# Altium footprint library TimeCard-NIC-V1.PcbLib: 104 footprints (part 5 of 7)
Each footprint in its own frame and in the unit in brackets; x right, y up, seen from the top. Pads: shape width x height; smd on the part's side, far side on the other; paste and mask are expansions set on the pad; w line width, h text height; cw(c..) or ccw(c..) is an arc to the next point about the centre after c.
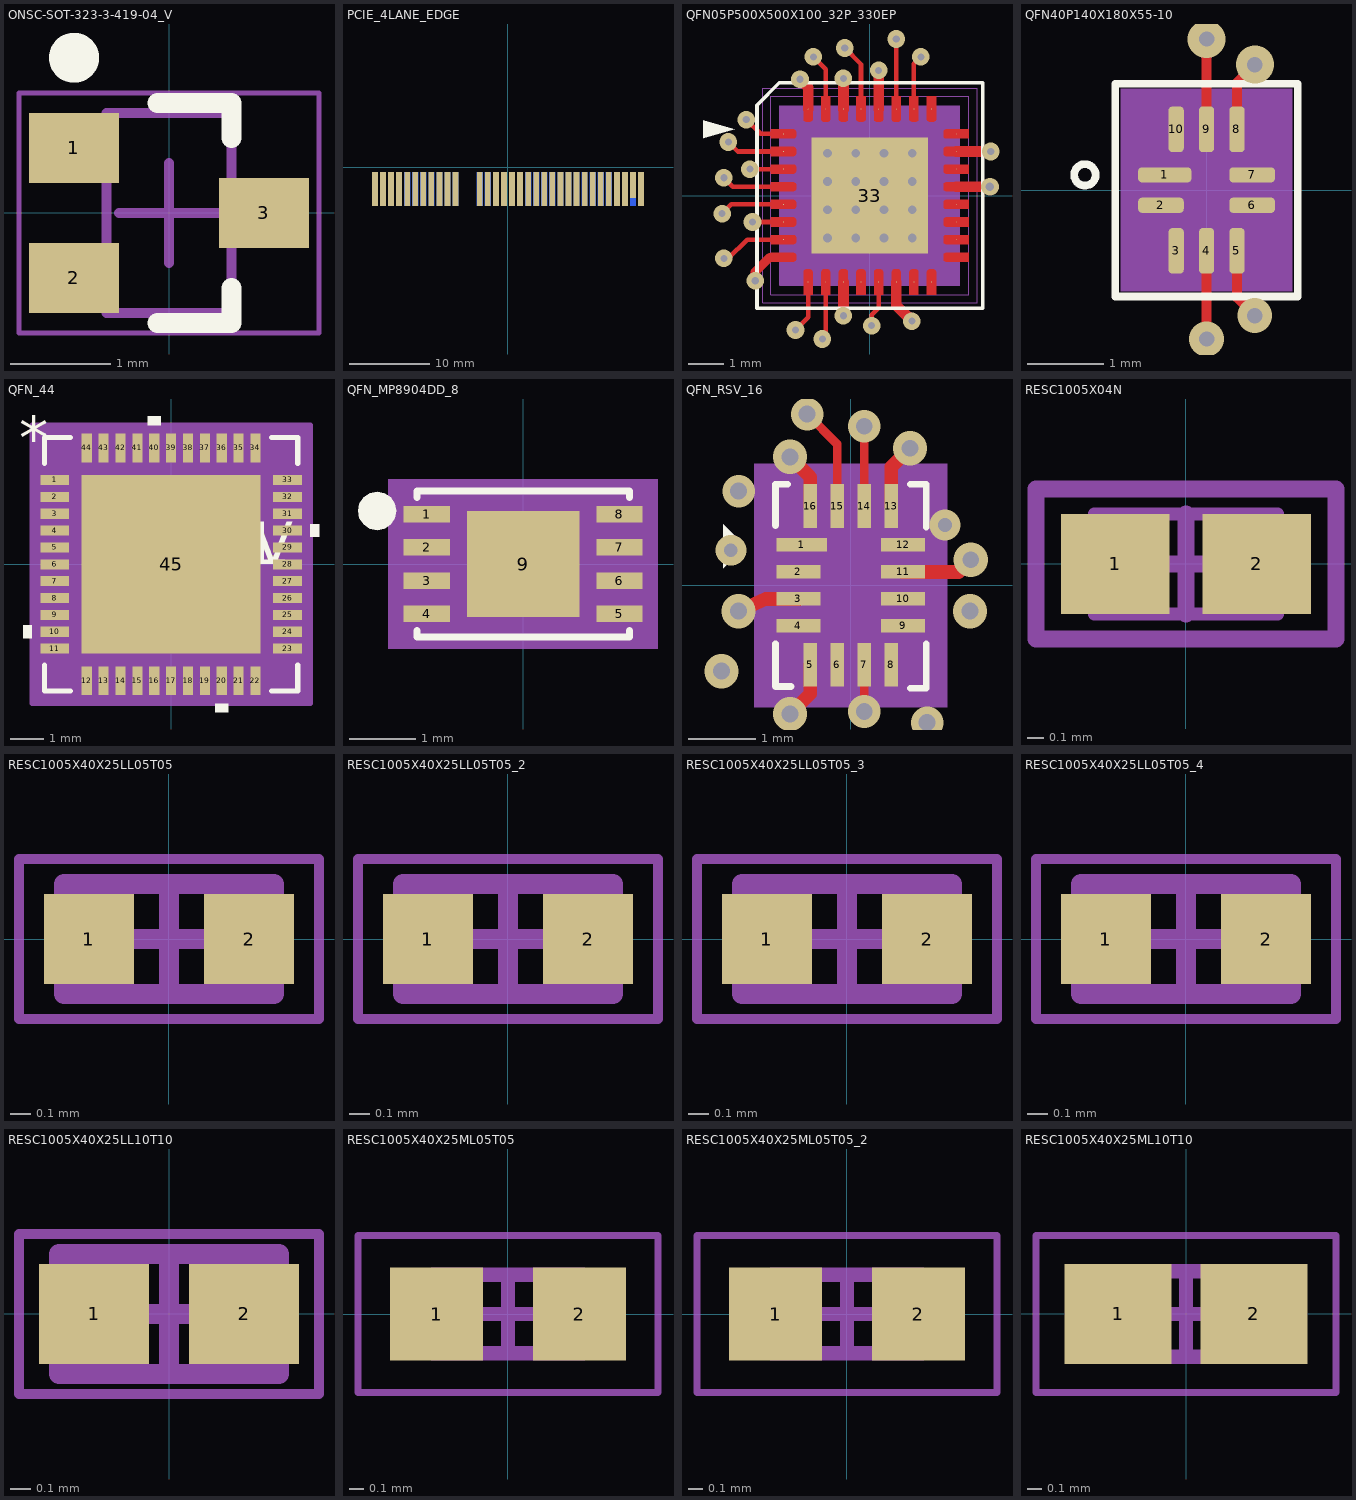
[diagram p4: the footprints below, top view; thin cyan lines are the x and y axes]

## ONSC-SOT-323-3-419-04_V [mm] "SOT23, 3-Leads, Body 2x1.25mm, Pitch 0.65mm"
height 1
pads (3):
  rect 0.9x0.7 smd: 1(-0.95,0.65) 2(-0.95,-0.65) 3(0.95,0)
Top Overlay:
  circle w0.25: c-0.95,1.55 r0.125
  lines w0.2: -0.113,-1.1 0.625,-1.1 0.625,-0.75 ; -0.113,1.1 0.625,1.1 0.625,0.75
Mechanical 13:
  lines w0.1: -0.625,-1 0.625,-1 0.625,1 -0.625,1 -0.625,-1
Mechanical 15:
  lines w0.05: -1.5,-1.2 1.5,-1.2 1.5,1.2 -1.5,1.2 -1.5,-1.2
  lines w0.1: -0.5,0 0.5,0 ; 0,-0.5 0,0.5
3D body: height 1, standoff 0, extent -0.625,-1 0.625,1

## PCIE_4LANE_EDGE [mil] "PCIE_4LANE_EDGE"
pads (64):
  rect 28x126 smd far side: A1(-649.6,-87.74)
  rect 28x165 smd far side: A2(-610.23,-107.24) A3(-570.86,-107.24) A4(-531.49,-107.24) A5(-492.12,-107.24) A6(-452.75,-107.24) A7(-413.38,-107.24) A8(-374.01,-107.24) A9(-334.64,-107.24) A10(-295.27,-107.24) A11(-255.9,-107.24) A12(-137.79,-107.24) A13(-98.42,-107.24) A14(-59.05,-107.24) A15(-19.68,-107.24) A16(19.69,-107.24) A17(59.06,-107.24) A18(98.43,-107.24) A19(137.8,-107.24) A20(177.17,-107.24) A21(216.54,-107.24) A22(255.91,-107.24) A23(295.28,-107.24) A24(334.65,-107.24) A25(374.02,-107.24) A26(413.39,-107.24) A27(452.76,-107.24) A28(492.13,-107.24) A29(531.5,-107.24) A30(570.87,-107.24) A31(610.24,-107.24) A32(649.61,-107.24)
  rect 28x165 smd: B1(-649.6,-107.24) B2(-610.23,-107.24) B3(-570.86,-107.24) B4(-531.49,-107.24) B5(-492.12,-107.24) B6(-452.75,-107.24) B7(-413.38,-107.24) B8(-374.01,-107.24) B9(-334.64,-107.24) B10(-295.27,-107.24) B11(-255.9,-107.24) B12(-137.79,-107.24) B13(-98.42,-107.24) B14(-59.05,-107.24) B15(-19.68,-107.24) B16(19.69,-107.24) B17(59.06,-107.24) B18(98.43,-107.24) B19(137.8,-107.24) B20(177.17,-107.24) B21(216.54,-107.24) B22(255.91,-107.24) B23(295.28,-107.24) B24(334.65,-107.24) B25(374.02,-107.24) B26(413.39,-107.24) B27(452.76,-107.24) B28(492.13,-107.24) B29(531.5,-107.24) B30(570.87,-107.24) B32(649.61,-107.24)
  rect 28x126 smd: B31(610.24,-87.74)

## QFN05P500X500X100_32P_330EP [mil] "QFN05P500X500X100_32P_330EP"
height 427.17
pads (33):
  oct 1x1 smd: 1(-96.5,68.9) 2(-96.5,49.21) 3(-96.5,29.53) 4(-96.5,9.84) 5(-96.5,-9.84) 6(-96.5,-29.53) 7(-96.5,-49.21) 8(-96.5,-68.9) 9(-68.9,-96.5) 10(-49.21,-96.5) 11(-29.53,-96.5) 12(-9.84,-96.5) 13(9.84,-96.5) 14(29.53,-96.5) 15(49.21,-96.5) 16(68.9,-96.5) 17(96.5,-68.9) 18(96.5,-49.21) 19(96.5,-29.53) 20(96.5,-9.84) 21(96.5,9.84) 22(96.5,29.53) 23(96.5,49.21) 24(96.5,68.9) 25(68.9,96.5) 26(49.21,96.5) 27(29.53,96.5) 28(9.84,96.5) 29(-9.84,96.5) 30(-29.53,96.5) 31(-49.21,96.5) 32(-68.9,96.5)
  rect 129.92x129.92 smd: 33(0,0)
via -53,-160.16 diameter 19.68 hole 8
via -83,-150.16 diameter 19.68 hole 8
via 2,-145.16 diameter 19.68 hole 8
via 47,-140.16 diameter 19.68 hole 8
via -29.53,-134.16 diameter 19.68 hole 8
via -128,-95.16 diameter 19.68 hole 8
via -163,-70.16 diameter 19.68 hole 8
via -47.24,-47.24 diameter 19 hole 9.8
via -15.75,-47.24 diameter 19 hole 9.8
via 15.75,-47.24 diameter 19 hole 9.8
via 47.24,-47.24 diameter 19 hole 9.8
via -131,-29.53 diameter 19.68 hole 8
via -165,-20.16 diameter 19.68 hole 8
via -47.24,-15.75 diameter 19 hole 9.8
via -15.75,-15.75 diameter 19 hole 9.8
via 15.75,-15.75 diameter 19 hole 9.8
via 47.24,-15.75 diameter 19 hole 9.8
via 134,9.84 diameter 20 hole 9.8
via -47.24,15.75 diameter 19 hole 9.8
via -15.75,15.75 diameter 19 hole 9.8
via 15.75,15.75 diameter 19 hole 9.8
via 47.24,15.75 diameter 19 hole 9.8
via -163,19.84 diameter 19.68 hole 8
via -134,29.53 diameter 19.68 hole 8
via -47.24,47.24 diameter 19 hole 9.8
via -15.75,47.24 diameter 19 hole 9.8
via 15.75,47.24 diameter 19 hole 9.8
via 47.24,47.24 diameter 19 hole 9.8
via 135,49.21 diameter 19.68 hole 8
via -158,59.84 diameter 19.68 hole 8
via -138,84.84 diameter 19.68 hole 8
via -78,129.84 diameter 19.68 hole 8
via -29.53,130.84 diameter 19.68 hole 8
via 9.84,139.84 diameter 19.68 hole 8
via -63,154.84 diameter 19.68 hole 8
via 57,154.84 diameter 19.68 hole 8
via -28,164.84 diameter 19.68 hole 8
via 29.53,174.84 diameter 19.68 hole 8
Top Layer:
  region: -66.93,-82.33 -70.87,-82.33 -71.49,-82.33 -72.65,-82.81 -73.54,-83.69 -74.02,-84.85 -74.02,-85.48 -74.02,-110.67 -63.78,-110.67 -63.78,-85.48 -63.78,-84.85 -64.26,-83.69 -65.14,-82.81 -66.3,-82.33
  region: -66.93,-82.33 -70.87,-82.33 -71.49,-82.33 -72.65,-82.81 -73.54,-83.69 -74.02,-84.85 -74.02,-85.48 -74.02,-110.67 -63.78,-110.67 -63.78,-85.48 -63.78,-84.85 -64.26,-83.69 -65.14,-82.81 -66.3,-82.33
  region: -47.24,-82.33 -51.18,-82.33 -51.81,-82.33 -52.97,-82.81 -53.85,-83.69 -54.33,-84.85 -54.33,-85.48 -54.33,-110.67 -44.09,-110.67 -44.09,-85.48 -44.09,-84.85 -44.57,-83.69 -45.46,-82.81 -46.62,-82.33
  region: -47.24,-82.33 -51.18,-82.33 -51.81,-82.33 -52.97,-82.81 -53.85,-83.69 -54.33,-84.85 -54.33,-85.48 -54.33,-110.67 -44.09,-110.67 -44.09,-85.48 -44.09,-84.85 -44.57,-83.69 -45.46,-82.81 -46.62,-82.33
  region: -27.56,-82.33 -31.5,-82.33 -32.12,-82.33 -33.28,-82.81 -34.17,-83.69 -34.65,-84.85 -34.65,-85.48 -34.65,-110.67 -24.41,-110.67 -24.41,-85.48 -24.41,-84.85 -24.89,-83.69 -25.77,-82.81 -26.93,-82.33
  region: -27.56,-82.33 -31.5,-82.33 -32.12,-82.33 -33.28,-82.81 -34.17,-83.69 -34.65,-84.85 -34.65,-85.48 -34.65,-110.67 -24.41,-110.67 -24.41,-85.48 -24.41,-84.85 -24.89,-83.69 -25.77,-82.81 -26.93,-82.33
  region: -7.87,-82.33 -11.81,-82.33 -12.44,-82.33 -13.6,-82.81 -14.48,-83.69 -14.96,-84.85 -14.96,-85.48 -14.96,-110.67 -4.72,-110.67 -4.72,-85.48 -4.72,-84.85 -5.2,-83.69 -6.09,-82.81 -7.25,-82.33
  region: -7.87,-82.33 -11.81,-82.33 -12.44,-82.33 -13.6,-82.81 -14.48,-83.69 -14.96,-84.85 -14.96,-85.48 -14.96,-110.67 -4.72,-110.67 -4.72,-85.48 -4.72,-84.85 -5.2,-83.69 -6.09,-82.81 -7.25,-82.33
  region: 11.81,-82.33 7.87,-82.33 7.25,-82.33 6.09,-82.81 5.2,-83.69 4.72,-84.85 4.72,-85.48 4.72,-110.67 14.96,-110.67 14.96,-85.48 14.96,-84.85 14.48,-83.69 13.6,-82.81 12.44,-82.33
  region: 11.81,-82.33 7.87,-82.33 7.25,-82.33 6.09,-82.81 5.2,-83.69 4.72,-84.85 4.72,-85.48 4.72,-110.67 14.96,-110.67 14.96,-85.48 14.96,-84.85 14.48,-83.69 13.6,-82.81 12.44,-82.33
  region: 31.5,-82.33 27.56,-82.33 26.93,-82.33 25.77,-82.81 24.89,-83.69 24.41,-84.85 24.41,-85.48 24.41,-110.67 34.65,-110.67 34.65,-85.48 34.65,-84.85 34.17,-83.69 33.28,-82.81 32.12,-82.33
  region: 31.5,-82.33 27.56,-82.33 26.93,-82.33 25.77,-82.81 24.89,-83.69 24.41,-84.85 24.41,-85.48 24.41,-110.67 34.65,-110.67 34.65,-85.48 34.65,-84.85 34.17,-83.69 33.28,-82.81 32.12,-82.33
  region: 51.18,-82.33 47.24,-82.33 46.62,-82.33 45.46,-82.81 44.57,-83.69 44.09,-84.85 44.09,-85.48 44.09,-110.67 54.33,-110.67 54.33,-85.48 54.33,-84.85 53.85,-83.69 52.97,-82.81 51.81,-82.33
  region: 51.18,-82.33 47.24,-82.33 46.62,-82.33 45.46,-82.81 44.57,-83.69 44.09,-84.85 44.09,-85.48 44.09,-110.67 54.33,-110.67 54.33,-85.48 54.33,-84.85 53.85,-83.69 52.97,-82.81 51.81,-82.33
  region: 70.87,-82.33 66.93,-82.33 66.3,-82.33 65.14,-82.81 64.26,-83.69 63.78,-84.85 63.78,-85.48 63.78,-110.67 74.02,-110.67 74.02,-85.48 74.02,-84.85 73.54,-83.69 72.65,-82.81 71.49,-82.33
  region: 70.87,-82.33 66.93,-82.33 66.3,-82.33 65.14,-82.81 64.26,-83.69 63.78,-84.85 63.78,-85.48 63.78,-110.67 74.02,-110.67 74.02,-85.48 74.02,-84.85 73.54,-83.69 72.65,-82.81 71.49,-82.33
  region: -82.33,-70.87 -82.33,-66.93 -82.33,-66.3 -82.81,-65.14 -83.69,-64.26 -84.85,-63.78 -85.48,-63.78 -110.67,-63.78 -110.67,-74.02 -85.48,-74.02 -84.85,-74.02 -83.69,-73.54 -82.81,-72.65 -82.33,-71.49
  region: -82.33,-70.87 -82.33,-66.93 -82.33,-66.3 -82.81,-65.14 -83.69,-64.26 -84.85,-63.78 -85.48,-63.78 -110.67,-63.78 -110.67,-74.02 -85.48,-74.02 -84.85,-74.02 -83.69,-73.54 -82.81,-72.65 -82.33,-71.49
  region: 82.33,-66.93 82.33,-70.87 82.33,-71.49 82.81,-72.65 83.69,-73.54 84.85,-74.02 85.48,-74.02 110.67,-74.02 110.67,-63.78 85.48,-63.78 84.85,-63.78 83.69,-64.26 82.81,-65.14 82.33,-66.3
  region: 82.33,-66.93 82.33,-70.87 82.33,-71.49 82.81,-72.65 83.69,-73.54 84.85,-74.02 85.48,-74.02 110.67,-74.02 110.67,-63.78 85.48,-63.78 84.85,-63.78 83.69,-64.26 82.81,-65.14 82.33,-66.3
  region: -82.33,-51.18 -82.33,-47.24 -82.33,-46.62 -82.81,-45.46 -83.69,-44.57 -84.85,-44.09 -85.48,-44.09 -110.67,-44.09 -110.67,-54.33 -85.48,-54.33 -84.85,-54.33 -83.69,-53.85 -82.81,-52.97 -82.33,-51.81
  region: -82.33,-51.18 -82.33,-47.24 -82.33,-46.62 -82.81,-45.46 -83.69,-44.57 -84.85,-44.09 -85.48,-44.09 -110.67,-44.09 -110.67,-54.33 -85.48,-54.33 -84.85,-54.33 -83.69,-53.85 -82.81,-52.97 -82.33,-51.81
  region: 82.33,-47.24 82.33,-51.18 82.33,-51.81 82.81,-52.97 83.69,-53.85 84.85,-54.33 85.48,-54.33 110.67,-54.33 110.67,-44.09 85.48,-44.09 84.85,-44.09 83.69,-44.57 82.81,-45.46 82.33,-46.62
  region: 82.33,-47.24 82.33,-51.18 82.33,-51.81 82.81,-52.97 83.69,-53.85 84.85,-54.33 85.48,-54.33 110.67,-54.33 110.67,-44.09 85.48,-44.09 84.85,-44.09 83.69,-44.57 82.81,-45.46 82.33,-46.62
  region: -82.33,-31.5 -82.33,-27.56 -82.33,-26.93 -82.81,-25.77 -83.69,-24.89 -84.85,-24.41 -85.48,-24.41 -110.67,-24.41 -110.67,-34.65 -85.48,-34.65 -84.85,-34.65 -83.69,-34.17 -82.81,-33.28 -82.33,-32.12
  region: -82.33,-31.5 -82.33,-27.56 -82.33,-26.93 -82.81,-25.77 -83.69,-24.89 -84.85,-24.41 -85.48,-24.41 -110.67,-24.41 -110.67,-34.65 -85.48,-34.65 -84.85,-34.65 -83.69,-34.17 -82.81,-33.28 -82.33,-32.12
  region: 82.33,-27.56 82.33,-31.5 82.33,-32.12 82.81,-33.28 83.69,-34.17 84.85,-34.65 85.48,-34.65 110.67,-34.65 110.67,-24.41 85.48,-24.41 84.85,-24.41 83.69,-24.89 82.81,-25.77 82.33,-26.93
  region: 82.33,-27.56 82.33,-31.5 82.33,-32.12 82.81,-33.28 83.69,-34.17 84.85,-34.65 85.48,-34.65 110.67,-34.65 110.67,-24.41 85.48,-24.41 84.85,-24.41 83.69,-24.89 82.81,-25.77 82.33,-26.93
  region: -82.33,-11.81 -82.33,-7.87 -82.33,-7.25 -82.81,-6.09 -83.69,-5.2 -84.85,-4.72 -85.48,-4.72 -110.67,-4.72 -110.67,-14.96 -85.48,-14.96 -84.85,-14.96 -83.69,-14.48 -82.81,-13.6 -82.33,-12.44
  region: -82.33,-11.81 -82.33,-7.87 -82.33,-7.25 -82.81,-6.09 -83.69,-5.2 -84.85,-4.72 -85.48,-4.72 -110.67,-4.72 -110.67,-14.96 -85.48,-14.96 -84.85,-14.96 -83.69,-14.48 -82.81,-13.6 -82.33,-12.44
  region: 82.33,-7.87 82.33,-11.81 82.33,-12.44 82.81,-13.6 83.69,-14.48 84.85,-14.96 85.48,-14.96 110.67,-14.96 110.67,-4.72 85.48,-4.72 84.85,-4.72 83.69,-5.2 82.81,-6.09 82.33,-7.25
  region: 82.33,-7.87 82.33,-11.81 82.33,-12.44 82.81,-13.6 83.69,-14.48 84.85,-14.96 85.48,-14.96 110.67,-14.96 110.67,-4.72 85.48,-4.72 84.85,-4.72 83.69,-5.2 82.81,-6.09 82.33,-7.25
  region: -82.33,7.87 -82.33,11.81 -82.33,12.44 -82.81,13.6 -83.69,14.48 -84.85,14.96 -85.48,14.96 -110.67,14.96 -110.67,4.72 -85.48,4.72 -84.85,4.72 -83.69,5.2 -82.81,6.09 -82.33,7.25
  region: -82.33,7.87 -82.33,11.81 -82.33,12.44 -82.81,13.6 -83.69,14.48 -84.85,14.96 -85.48,14.96 -110.67,14.96 -110.67,4.72 -85.48,4.72 -84.85,4.72 -83.69,5.2 -82.81,6.09 -82.33,7.25
  region: 82.33,11.81 82.33,7.87 82.33,7.25 82.81,6.09 83.69,5.2 84.85,4.72 85.48,4.72 110.67,4.72 110.67,14.96 85.48,14.96 84.85,14.96 83.69,14.48 82.81,13.6 82.33,12.44
  region: 82.33,11.81 82.33,7.87 82.33,7.25 82.81,6.09 83.69,5.2 84.85,4.72 85.48,4.72 110.67,4.72 110.67,14.96 85.48,14.96 84.85,14.96 83.69,14.48 82.81,13.6 82.33,12.44
  region: -82.33,27.56 -82.33,31.5 -82.33,32.12 -82.81,33.28 -83.69,34.17 -84.85,34.65 -85.48,34.65 -110.67,34.65 -110.67,24.41 -85.48,24.41 -84.85,24.41 -83.69,24.89 -82.81,25.77 -82.33,26.93
  region: -82.33,27.56 -82.33,31.5 -82.33,32.12 -82.81,33.28 -83.69,34.17 -84.85,34.65 -85.48,34.65 -110.67,34.65 -110.67,24.41 -85.48,24.41 -84.85,24.41 -83.69,24.89 -82.81,25.77 -82.33,26.93
  region: 82.33,31.5 82.33,27.56 82.33,26.93 82.81,25.77 83.69,24.89 84.85,24.41 85.48,24.41 110.67,24.41 110.67,34.65 85.48,34.65 84.85,34.65 83.69,34.17 82.81,33.28 82.33,32.12
  region: 82.33,31.5 82.33,27.56 82.33,26.93 82.81,25.77 83.69,24.89 84.85,24.41 85.48,24.41 110.67,24.41 110.67,34.65 85.48,34.65 84.85,34.65 83.69,34.17 82.81,33.28 82.33,32.12
  region: -82.33,47.24 -82.33,51.18 -82.33,51.81 -82.81,52.97 -83.69,53.85 -84.85,54.33 -85.48,54.33 -110.67,54.33 -110.67,44.09 -85.48,44.09 -84.85,44.09 -83.69,44.57 -82.81,45.46 -82.33,46.62
  region: -82.33,47.24 -82.33,51.18 -82.33,51.81 -82.81,52.97 -83.69,53.85 -84.85,54.33 -85.48,54.33 -110.67,54.33 -110.67,44.09 -85.48,44.09 -84.85,44.09 -83.69,44.57 -82.81,45.46 -82.33,46.62
  region: 82.33,51.18 82.33,47.24 82.33,46.62 82.81,45.46 83.69,44.57 84.85,44.09 85.48,44.09 110.67,44.09 110.67,54.33 85.48,54.33 84.85,54.33 83.69,53.85 82.81,52.97 82.33,51.81
  region: 82.33,51.18 82.33,47.24 82.33,46.62 82.81,45.46 83.69,44.57 84.85,44.09 85.48,44.09 110.67,44.09 110.67,54.33 85.48,54.33 84.85,54.33 83.69,53.85 82.81,52.97 82.33,51.81
  region: -82.33,66.93 -82.33,70.87 -82.33,71.49 -82.81,72.65 -83.69,73.54 -84.85,74.02 -85.48,74.02 -110.67,74.02 -110.67,63.78 -85.48,63.78 -84.85,63.78 -83.69,64.26 -82.81,65.14 -82.33,66.3
  region: -82.33,66.93 -82.33,70.87 -82.33,71.49 -82.81,72.65 -83.69,73.54 -84.85,74.02 -85.48,74.02 -110.67,74.02 -110.67,63.78 -85.48,63.78 -84.85,63.78 -83.69,64.26 -82.81,65.14 -82.33,66.3
  region: 82.33,70.87 82.33,66.93 82.33,66.3 82.81,65.14 83.69,64.26 84.85,63.78 85.48,63.78 110.67,63.78 110.67,74.02 85.48,74.02 84.85,74.02 83.69,73.54 82.81,72.65 82.33,71.49
  region: 82.33,70.87 82.33,66.93 82.33,66.3 82.81,65.14 83.69,64.26 84.85,63.78 85.48,63.78 110.67,63.78 110.67,74.02 85.48,74.02 84.85,74.02 83.69,73.54 82.81,72.65 82.33,71.49
  region: -70.87,82.33 -66.93,82.33 -66.3,82.33 -65.14,82.81 -64.26,83.69 -63.78,84.85 -63.78,85.48 -63.78,110.67 -74.02,110.67 -74.02,85.48 -74.02,84.85 -73.54,83.69 -72.65,82.81 -71.49,82.33
  region: -70.87,82.33 -66.93,82.33 -66.3,82.33 -65.14,82.81 -64.26,83.69 -63.78,84.85 -63.78,85.48 -63.78,110.67 -74.02,110.67 -74.02,85.48 -74.02,84.85 -73.54,83.69 -72.65,82.81 -71.49,82.33
  region: -51.18,82.33 -47.24,82.33 -46.62,82.33 -45.46,82.81 -44.57,83.69 -44.09,84.85 -44.09,85.48 -44.09,110.67 -54.33,110.67 -54.33,85.48 -54.33,84.85 -53.85,83.69 -52.97,82.81 -51.81,82.33
  region: -51.18,82.33 -47.24,82.33 -46.62,82.33 -45.46,82.81 -44.57,83.69 -44.09,84.85 -44.09,85.48 -44.09,110.67 -54.33,110.67 -54.33,85.48 -54.33,84.85 -53.85,83.69 -52.97,82.81 -51.81,82.33
  region: -31.5,82.33 -27.56,82.33 -26.93,82.33 -25.77,82.81 -24.89,83.69 -24.41,84.85 -24.41,85.48 -24.41,110.67 -34.65,110.67 -34.65,85.48 -34.65,84.85 -34.17,83.69 -33.28,82.81 -32.12,82.33
  region: -31.5,82.33 -27.56,82.33 -26.93,82.33 -25.77,82.81 -24.89,83.69 -24.41,84.85 -24.41,85.48 -24.41,110.67 -34.65,110.67 -34.65,85.48 -34.65,84.85 -34.17,83.69 -33.28,82.81 -32.12,82.33
  region: -11.81,82.33 -7.87,82.33 -7.25,82.33 -6.09,82.81 -5.2,83.69 -4.72,84.85 -4.72,85.48 -4.72,110.67 -14.96,110.67 -14.96,85.48 -14.96,84.85 -14.48,83.69 -13.6,82.81 -12.44,82.33
  region: -11.81,82.33 -7.87,82.33 -7.25,82.33 -6.09,82.81 -5.2,83.69 -4.72,84.85 -4.72,85.48 -4.72,110.67 -14.96,110.67 -14.96,85.48 -14.96,84.85 -14.48,83.69 -13.6,82.81 -12.44,82.33
  region: 7.87,82.33 11.81,82.33 12.44,82.33 13.6,82.81 14.48,83.69 14.96,84.85 14.96,85.48 14.96,110.67 4.72,110.67 4.72,85.48 4.72,84.85 5.2,83.69 6.09,82.81 7.25,82.33
  region: 7.87,82.33 11.81,82.33 12.44,82.33 13.6,82.81 14.48,83.69 14.96,84.85 14.96,85.48 14.96,110.67 4.72,110.67 4.72,85.48 4.72,84.85 5.2,83.69 6.09,82.81 7.25,82.33
  region: 27.56,82.33 31.5,82.33 32.12,82.33 33.28,82.81 34.17,83.69 34.65,84.85 34.65,85.48 34.65,110.67 24.41,110.67 24.41,85.48 24.41,84.85 24.89,83.69 25.77,82.81 26.93,82.33
  region: 27.56,82.33 31.5,82.33 32.12,82.33 33.28,82.81 34.17,83.69 34.65,84.85 34.65,85.48 34.65,110.67 24.41,110.67 24.41,85.48 24.41,84.85 24.89,83.69 25.77,82.81 26.93,82.33
  region: 47.24,82.33 51.18,82.33 51.81,82.33 52.97,82.81 53.85,83.69 54.33,84.85 54.33,85.48 54.33,110.67 44.09,110.67 44.09,85.48 44.09,84.85 44.57,83.69 45.46,82.81 46.62,82.33
  region: 47.24,82.33 51.18,82.33 51.81,82.33 52.97,82.81 53.85,83.69 54.33,84.85 54.33,85.48 54.33,110.67 44.09,110.67 44.09,85.48 44.09,84.85 44.57,83.69 45.46,82.81 46.62,82.33
  region: 66.93,82.33 70.87,82.33 71.49,82.33 72.65,82.81 73.54,83.69 74.02,84.85 74.02,85.48 74.02,110.67 63.78,110.67 63.78,85.48 63.78,84.85 64.26,83.69 65.14,82.81 66.3,82.33
  region: 66.93,82.33 70.87,82.33 71.49,82.33 72.65,82.81 73.54,83.69 74.02,84.85 74.02,85.48 74.02,110.67 63.78,110.67 63.78,85.48 63.78,84.85 64.26,83.69 65.14,82.81 66.3,82.33
  lines w5.2: -165,-20.16 -154.69,-9.84 -96.5,-9.84 ; -163,-70.16 -158,-70.16 -137.06,-49.21 -96.5,-49.21 ; -163,19.84 -153,9.84 -96.5,9.84 ; -158,59.84 -147.37,49.21 -96.5,49.21 ; -138,84.84 -122.06,68.9 -96.5,68.9 ; -134,29.53 -96.5,29.53 ; -131,-29.53 -96.5,-29.53 ; -83,-150.16 -68.9,-136.06 -68.9,-96.5 ; -63,154.84 -49.21,141.06 -49.21,96.5 ; -53,-160.16 -49.21,-156.37 -49.21,-96.5 ; -28,164.84 -9.84,146.69 -9.84,96.5 ; 2,-145.16 2,-133.16 9.84,-125.31 9.84,-96.5 ; 29.53,96.5 29.53,174.84 ; 49.21,96.5 49.21,147.06 57,154.84
  lines w10: -128,-95.16 -128,-85.16 -111.74,-68.9 -96.5,-68.9
  lines w12: -78,129.84 -68.9,120.74 -68.9,96.5 ; -29.53,-134.16 -29.53,-96.5 ; -29.53,96.5 -29.53,130.84 ; 9.84,96.5 9.84,139.84 ; 29.53,-96.5 29.53,-122.69 47,-140.16 ; 96.5,9.84 134,9.84 ; 96.5,49.21 135,49.21
Top Overlay:
  dashed: -186,83.9 -186,63.9 -151,73.9
  lines w4: -126,-126 126,-126 126,126 -101,126 -126,101 -126,-126
  text ".Designator" at -236.46,38.21 h30
Top Paste:
  drawing of 9 lines, arcs and shapes, not listed
Top Solder:
  drawing of 64 lines, arcs and shapes, not listed
Top 3D Body:
  region: -100.39,-100.39 100.39,-100.39 100.39,100.39 -100.39,100.39
Top Courtyard:
  lines w1: -110.67,-110.67 -110.67,110.67 110.67,110.67 110.67,-110.67 -110.67,-110.67
Top Assembly:
  lines w1: -100.39,-100.39 100.39,-100.39 100.39,100.39 -100.39,100.39 -100.39,-100.39
Bottom Component Center:
  text "19" at 96.5,-49.53 h25
  text "18" at 96.5,-69.21 h25
  text "20" at 96.5,-29.84 h25
  text "22" at 96.5,9.53 h25
  text "24" at 96.5,48.9 h25
  text "26" at 49.21,76.5 h25
  text "21" at 96.5,-10.16 h25
  text "33" at 0,-20 h25
  text "23" at 96.5,29.21 h25
  text "14" at 29.53,-116.5 h25
  text "11" at -29.53,-116.5 h25
  text "28" at 9.84,76.5 h25
  text "30" at -29.53,76.5 h25
  text "32" at -68.9,76.5 h25
  text "8" at -96.5,-78.9 h25
  text "27" at 29.53,76.5 h25
  text "13" at 9.84,-116.5 h25
  text "10" at -49.21,-116.5 h25
  text "9" at -68.9,-106.5 h25
  text "7" at -96.5,-59.21 h25
  text "6" at -96.5,-39.53 h25
  text "29" at -9.84,76.5 h25
  text "4" at -96.5,-0.16 h25
  text "3" at -96.5,19.53 h25
  text "2" at -96.5,39.21 h25
  text "5" at -96.5,-19.84 h25
  text "31" at -49.21,76.5 h25
  text "1" at -96.5,58.9 h25
  text "25" at 68.9,76.5 h25
  text "16" at 68.9,-116.5 h25
  text "15" at 49.21,-116.5 h25
  text "12" at -9.84,-116.5 h25
  text "17" at 96.5,-88.9 h25
Top Component Outline:
  text "MFR:SMSC USB 3320" at -700,1075 h25
  text "SYM NAME:USB3320_QFN32" at -700,1000 h25
  text "COMP HT:40 MIL" at -700,925 h25
  text "PADSTACKS:S130, R10_34, R34_10" at -700,850 h25
  text "DIM IN INCH [MM]" at -700,775 h25
  text "CREATED BY MVU 08-10-10" at -700,700 h25
  text "CONVERTED TO METRIC AND UPDATED FOR 2018 LIBRARY." at -547.24,543.31 h25
  text "C. HENLEY 12-10-18" at -531.5,448.82 h25
  text "CORRECT PADSTACKS AND PADSTACK NAME, REPLACED VIAS.  CH 2-28-20" at -700.79,350.39 h25
Mechanical 30:
  lines w1: -119.73,-119.73 -119.73,119.73 119.73,119.73 119.73,-119.73 -119.73,-119.73
3D body: height 150, standoff 0, extent -100.39,-100.39 100.39,100.39

## QFN40P140X180X55-10 [mm] "QFN40P140X180X55-10"
height 10.85
pads (10):
  rrect50% 0.7x0.2 smd: 1(-0.55,0.2)
  rrect50% 0.6x0.2 smd: 2(-0.6,-0.2) 6(0.6,-0.2) 7(0.6,0.2)
  rrect50% 0.2x0.6 smd: 3(-0.4,-0.8) 4(0,-0.8) 5(0.4,-0.8) 8(0.4,0.8) 9(0,0.8) 10(-0.4,0.8)
via 0,-1.96 diameter 0.457 hole 0.203
via 0.635,-1.651 diameter 0.457 hole 0.203
via 0.635,1.651 diameter 0.5 hole 0.203
via 0,1.988 diameter 0.5 hole 0.203
Top Layer:
  lines w0.127: 0,-1.96 0,-0.8 ; 0.4,-0.8 0.4,-1.416 0.635,-1.651
  lines w0.132: 0,0.8 0,1.988 ; 0.4,0.8 0.4,1.416 0.635,1.651
Top Overlay:
  circle w0.102: c-1.6,0.2 r0.141
  lines w0.102: -1.2,-1.4 1.2,-1.4 1.2,1.4 -1.2,1.4 -1.2,-1.4
  text ".Designator" at 0.914,-2.269 h0.76
Top 3D Body:
  region: -0.725,0.925 -0.725,-0.925 0.725,-0.925 0.725,0.925
Top Courtyard:
  dashed: -0.9,-1.1 0.9,-1.1 0.9,1.1 -0.9,1.1
Top Assembly:
  circle w0.025: c-0.5,0.2 r0.141
  lines w0.025: -0.725,-0.925 0.725,-0.925 0.725,0.925 -0.725,0.925 -0.725,-0.925
Bottom Component Center:
  text "4" at 0,-1.718 h1.4
  text "5" at 0.4,-1.718 h1.4
  text "3" at -0.4,-1.718 h1.4
  text "2" at -0.8,-1.318 h1.4
  text "1" at -0.8,-0.918 h1.4
  text "6" at 0.5,-1.418 h1.4
  text "10" at -0.3,-1.435 h1.4
  text "7" at 0.5,-0.918 h1.4
  text "9" at 0,-0.318 h1.4
  text "8" at 0.4,-0.318 h1.4
Mechanical 26:
  dashed: -1.13,-1.33 1.13,-1.33 1.13,1.33 -1.13,1.33
Top Component Outline:
  text "MFR: TI" at -7.957,23.696 h1.27
  text "SYM NAME:QFN40P140X180X55-10" at -8.007,21.669 h1.27
  text "MFG PART NUMBER: SN74AVC2T245RSWR" at -7.78,19.566 h1.27
  text "COMP HT:0.55MM" at -7.831,17.659 h1.27
  text "PADSTACKS:r60_20r5, r70_20r5" at -7.831,15.119 h1.27
  text "DIM: MM" at -7.831,12.979 h1.27
  text "PKG TYPE NAME:BGA_QFN" at -7.957,10.691 h1.27
  text "CREATED BY:VA" at -8.186,8.377 h1.27
  text "CHECKED BY:" at -8.236,5.977 h1.27
3D body: height 3.81, standoff 0, extent -0.725,-0.925 0.725,0.925

## QFN_44 [mm]
pads (45):
  rect 0.85x0.3 smd paste-0.15: 1(-3.45,2.501) 2(-3.45,2.001) 3(-3.45,1.5) 4(-3.45,1) 5(-3.45,0.5) 6(-3.45,0) 7(-3.45,-0.5) 8(-3.45,-1) 9(-3.45,-1.5) 10(-3.45,-2.001) 11(-3.45,-2.501) 23(3.45,-2.501) 24(3.45,-2.001) 25(3.45,-1.5) 26(3.45,-1) 27(3.45,-0.5) 28(3.45,0) 29(3.45,0.5) 30(3.45,1) 31(3.45,1.5) 32(3.45,2.001) 33(3.45,2.501)
  rect 0.3x0.85 smd paste-0.15: 12(-2.501,-3.45) 13(-2.001,-3.45) 14(-1.5,-3.45) 15(-1,-3.45) 16(-0.5,-3.45) 17(0,-3.45) 18(0.5,-3.45) 19(1,-3.45) 20(1.5,-3.45) 21(2.001,-3.45) 22(2.501,-3.45) 34(2.501,3.45) 35(2.001,3.45) 36(1.5,3.45) 37(1,3.45) 38(0.5,3.45) 39(0,3.45) 40(-0.5,3.45) 41(-1,3.45) 42(-1.5,3.45) 43(-2.001,3.45) 44(-2.501,3.45)
  rect 5.3x5.3 smd paste-2.65: 45(0,0)
Top Overlay:
  region: -4.129,-1.81 -4.383,-1.81 -4.383,-2.191 -4.129,-2.191
  region: 1.691,-4.129 1.31,-4.129 1.31,-4.383 1.691,-4.383
  region: 4.129,1.191 4.383,1.191 4.383,0.81 4.129,0.81
  region: -0.31,4.129 -0.691,4.129 -0.691,4.383 -0.31,4.383
  lines w0.152: -3.754,-2.983 -3.754,-3.754 -2.983,-3.754 ; -3.754,2.983 -3.754,3.754 -2.983,3.754 ; 2.983,-3.754 3.754,-3.754 3.754,-2.983 ; 2.983,3.754 3.754,3.754 3.754,2.983
  text "*" at -4.51,3.132 h1.27
  text "PN" at 0,0 h1.27
  text "DEV" at 0,0 h1.27
  text "VAL" at 0,0 h1.27
  text "TOL" at 0,0 h1.27
Top Paste:
  drawing of 61 lines, arcs and shapes, not listed
Top Solder:
  drawing of 44 lines, arcs and shapes, not listed
Mechanical 13:
  text "*" at -4.51,3.132 h1.27
  text "RefDes2" at 0,0 h1.27
Mechanical 15:
  region: 4.129,-4.129 -4.129,-4.129 -4.129,4.129 4.129,4.129
  lines w0.152: -4.129,-4.129 -4.129,4.129 4.129,4.129 4.129,-4.129 -4.129,-4.129

## QFN_MP8904DD_8 [mm] "QFN_MP8904DD_8"
height 10.85
pads (9):
  rect 0.7x0.25 smd: 1(-1.45,0.75) 2(-1.45,0.25) 3(-1.45,-0.25) 4(-1.45,-0.75) 5(1.45,-0.75) 6(1.45,-0.25) 7(1.45,0.25) 8(1.45,0.75)
  rect 1.7x1.6 smd: 9(0,0)
Top Overlay:
  dashed: -2.488,0.8 -2.466,0.69 -2.404,0.596 -2.31,0.534 -2.2,0.512 -2.09,0.534 -2.058,0.555 -1.996,0.596 -1.934,0.69 -1.912,0.8 -1.934,0.91 -1.996,1.004 -2.058,1.045 -2.09,1.066 -2.2,1.088 -2.31,1.066 -2.404,1.004 -2.466,0.91
  lines w0.102: -1.6,-1 -1.6,-1.1 1.6,-1.1 1.6,-1 ; -1.6,1 -1.6,1.1 1.6,1.1 1.6,1
  text ".Designator" at 4.003,0.84 h0.76
Top Paste:
  dashed: -0.5,0.55 -0.5,0.05 -0.1,0.05 -0.1,0.55
  dashed: 0.1,0.55 0.1,0.05 0.5,0.05 0.5,0.55
  dashed: -0.5,-0.05 -0.5,-0.55 -0.1,-0.55 -0.1,-0.05
  dashed: 0.1,-0.05 0.1,-0.55 0.5,-0.55 0.5,-0.05
Top 3D Body:
  region: -1.55,1.05 -1.55,-1.05 1.55,-1.05 1.55,1.05
Top Courtyard:
  dashed: -1.8,-1.05 1.8,-1.05 1.8,1.05 -1.8,1.05
Top Assembly:
  dashed: -1.428,0.8 -1.411,0.713 -1.361,0.639 -1.287,0.589 -1.2,0.572 -1.113,0.589 -1.088,0.606 -1.039,0.639 -0.989,0.713 -0.972,0.8 -0.989,0.887 -1.039,0.961 -1.088,0.994 -1.113,1.011 -1.2,1.028 -1.287,1.011 -1.361,0.961 -1.411,0.887
  lines w0.025: -1.55,-1.05 1.55,-1.05 1.55,1.05 -1.55,1.05 -1.55,-1.05
Bottom Component Center:
  text "1" at -1.035,0.65 h0.76
  text "6" at 1.625,-0.33 h0.76
  text "9" at 0.61,0 h0.76
  text "8" at 1.625,0.67 h0.76
  text "5" at 1.865,-0.85 h0.76
  text "4" at -1.035,-0.85 h0.76
  text "3" at -1.035,-0.35 h0.76
  text "7" at 1.625,0.17 h0.76
  text "2" at -1.035,0.15 h0.76
Mechanical 26:
  dashed: -2.03,-1.28 2.03,-1.28 2.03,1.28 -2.03,1.28
Top Component Outline:
  text "CREATED BY: C. HENLEY 9-16-19" at -1.6,9.5 h0.89
  text "MPS# MP8904DD" at -1.3,13.4 h0.89
  text "PKG: QFN_MP8904DD_8" at -1.6,11.5 h0.89
  text "CHECKED BY:" at -1.6,7.5 h0.89
3D body: height 3.81, standoff 0, extent -1.55,-1.05 1.55,1.05

## QFN_RSV_16 [mm] "QFN_RSV_16"
height 10.85
pads (16):
  rect 0.75x0.2 smd: 1(-0.725,0.6)
  rect 0.65x0.2 smd: 2(-0.775,0.2) 3(-0.775,-0.2) 4(-0.775,-0.6) 9(0.775,-0.6) 10(0.775,-0.2) 11(0.775,0.2) 12(0.775,0.6)
  rect 0.2x0.65 smd: 5(-0.6,-1.175) 6(-0.2,-1.175) 7(0.2,-1.175) 8(0.6,-1.175) 13(0.6,1.175) 14(0.2,1.175) 15(-0.2,1.175) 16(-0.6,1.175)
via -0.647,2.54 diameter 0.483 hole 0.249
via 0.2,2.358 diameter 0.483 hole 0.249
via 0.877,2.032 diameter 0.508 hole 0.249
via -0.901,1.905 diameter 0.508 hole 0.249
via -1.663,1.397 diameter 0.483 hole 0.249
via 1.397,0.896 diameter 0.457 hole 0.203
via -1.777,0.521 diameter 0.457 hole 0.203
via 1.778,0.381 diameter 0.508 hole 0.249
via 1.766,-0.381 diameter 0.508 hole 0.249
via -1.663,-0.381 diameter 0.508 hole 0.249
via -1.917,-1.27 diameter 0.508 hole 0.249
via 0.2,-1.868 diameter 0.483 hole 0.249
via -0.901,-1.905 diameter 0.508 hole 0.249
via 1.131,-2.032 diameter 0.483 hole 0.249
via -0.393,-2.413 diameter 0.483 hole 0.249
Top Layer:
  lines w0.132: -0.647,2.54 -0.2,2.093 -0.2,1.175 ; 0.2,-1.868 0.2,-1.175 ; 0.2,1.175 0.2,2.358
  lines w0.203: -1.663,-0.381 -1.259,-0.2 -0.775,-0.2 ; -0.901,-1.905 -0.6,-1.604 -0.6,-1.175 ; -0.901,1.905 -0.6,1.604 -0.6,1.175 ; 0.6,1.175 0.6,1.755 0.877,2.032 ; 0.775,0.2 1.597,0.2 1.778,0.381
Top Overlay:
  dashed: -1.562,0.582 -1.89,0.253 -1.89,0.91
  lines w0.102: -1.118,-0.864 -1.118,-1.499 -0.887,-1.499 ; -1.118,0.889 -1.118,1.499 -0.938,1.499 ; 0.887,-1.524 1.118,-1.524 1.118,-0.864 ; 0.887,1.499 1.118,1.499 1.118,0.864
Top 3D Body:
  region: -0.925,1.325 -0.925,-1.325 0.925,-1.325 0.925,1.325
Top Courtyard:
  dashed: -1.1,-1.5 -1.1,1.5 1.1,1.5 1.1,-1.5
Top Assembly:
  lines w0.025: -0.925,-1.325 -0.925,1.325 0.925,1.325 0.925,-1.325 -0.925,-1.325
  text ".Designator" at -0.356,-0.152 h0.64
Bottom Component Center:
  text "9" at 0.775,-0.601 h0.64
  text "7" at 0.2,-1.176 h0.64
  text "6" at -0.2,-1.176 h0.64
  text "3" at -0.775,-0.201 h0.64
  text "4" at -0.775,-0.601 h0.64
  text "1" at -0.575,0.853 h0.64
  text "8" at 0.6,-1.176 h0.64
  text "14" at 0.2,1.428 h0.64
  text "5" at -0.6,-1.176 h0.64
  text "10" at 0.775,0.053 h0.64
  text "11" at 0.775,0.453 h0.64
  text "16" at -0.6,1.428 h0.64
  text "15" at -0.2,1.428 h0.64
  text "2" at -0.775,0.199 h0.64
  text "12" at 0.775,0.853 h0.64
  text "13" at 0.55,1.403 h0.64
Top Component Outline:
  text "PADSTACKS: B8_26, B26_8" at -13.818,18.618 h1.27
  text "DIM IN INCH [MM]" at -13.818,16.078 h1.27
  text "COMP. HT: 22 MIL" at -13.818,21.158 h1.27
  text "SYMB NAME: QFN_RSV_16" at -13.818,23.698 h1.27
  text "MAN: TI SN74AVC4T245RSVR" at -13.564,26.238 h1.27
  text "CHECK BY MVU 08-25-10" at -13.767,13.843 h1.27
  text "CONVERTED TO METRIC AND VARIOUS CHANGES FOR 2018 LIBRARY." at -11.049,10.82 h1.27
  text "RE-CHECKED BY: GREGI 02/20/19" at -16.865,8.277 h1.27
Mechanical 30:
  dashed: -1.429,-1.805 -1.429,1.805 1.429,1.805 1.429,-1.805
3D body: height 3.81, standoff 0, extent -0.925,-1.325 0.925,1.325

## RESC1005X04N [mm] "Chip Resistor, 0402, 2-Leads, Body 1.00x0.50mm, IPC Medium Density"
height 0.4
pads (2):
  rect 0.65x0.6 smd: 1(-0.425,0) 2(0.425,0)
Mechanical 13:
  lines w0.076: -0.55,-0.3 0.55,-0.3 0.55,0.3 -0.55,0.3 -0.55,-0.3
  text ".Designator" at 2.251,-0.52 h1.02
Mechanical 15:
  lines w0.102: -0.3,0 0.3,0 ; 0,-0.3 0,0.3 ; -0.9,-0.45 0.9,-0.45 0.9,0.45 -0.9,0.45 -0.9,-0.45
3D body: height 0.4, standoff 0, extent 0.32,-0.3 0.55,0.3
3D body: height 0.4, standoff 0, extent -0.55,-0.3 -0.32,0.3
3D body: height 0.4, standoff 0, extent -0.32,-0.3 0.32,0.3

## RESC1005X40X25LL05T05 [mm] "Chip Resistor, 2-Leads, Body 1.05x0.55mm, IPC High Density"
height 0.4
pads (2):
  rect 0.45x0.45 smd: 1(-0.4,0) 2(0.4,0)
Mechanical 13:
  lines w0.1: -0.525,-0.275 -0.525,0.275 0.525,0.275 0.525,-0.275 -0.525,-0.275
Mechanical 15:
  lines w0.05: -0.75,-0.4 -0.75,0.4 0.75,0.4 0.75,-0.4 -0.75,-0.4
  lines w0.1: -0.275,0 0.275,0 ; 0,-0.275 0,0.275
3D body "RESC1005X04L.step": height 0.4, standoff 0, extent -0.525,-0.275 0.525,0.275

## RESC1005X40X25LL05T05_2 [mm]
pads (2):
  rect 0.45x0.45 smd: 1(-0.4,0) 2(0.4,0)
Mechanical 13:
  lines w0.1: -0.525,-0.275 0.525,-0.275 0.525,0.275 -0.525,0.275 -0.525,-0.275
Mechanical 15:
  lines w0.05: -0.75,-0.4 0.75,-0.4 0.75,0.4 -0.75,0.4 -0.75,-0.4
  lines w0.1: -0.275,0 0.275,0 ; 0,-0.275 0,0.275
3D body: height 0.4, standoff 0, extent 0.275,-0.275 0.525,0.275
3D body: height 0.4, standoff 0, extent -0.525,-0.275 -0.275,0.275
3D body: height 0.4, standoff 0, extent -0.275,-0.275 0.275,0.275

## RESC1005X40X25LL05T05_3 [mm]
pads (2):
  rect 0.45x0.45 smd: 1(-0.4,0) 2(0.4,0)
Mechanical 13:
  lines w0.1: -0.525,-0.275 0.525,-0.275 0.525,0.275 -0.525,0.275 -0.525,-0.275
Mechanical 15:
  lines w0.05: -0.75,-0.4 0.75,-0.4 0.75,0.4 -0.75,0.4 -0.75,-0.4
  lines w0.1: -0.275,0 0.275,0 ; 0,-0.275 0,0.275
3D body "RESC1005X04L.step": height 0.4, standoff 0, extent -0.525,-0.275 0.525,0.275

## RESC1005X40X25LL05T05_4 [mm]
pads (2):
  rect 0.45x0.45 smd: 1(-0.4,0) 2(0.4,0)
Mechanical 13:
  lines w0.1: -0.525,-0.275 0.525,-0.275 0.525,0.275 -0.525,0.275 -0.525,-0.275
Mechanical 15:
  lines w0.05: -0.75,-0.4 0.75,-0.4 0.75,0.4 -0.75,0.4 -0.75,-0.4
  lines w0.1: -0.275,0 0.275,0 ; 0,-0.275 0,0.275
3D body "RESC1005X04L.step": height 0.4, standoff 0, extent -0.525,-0.275 0.525,0.275

## RESC1005X40X25LL10T10 [mm] "Chip Resistor, 2-Leads, Body 1.00x0.50mm, IPC High Density"
height 0.4
pads (2):
  rect 0.55x0.5 smd: 1(-0.375,0) 2(0.375,0)
Mechanical 13:
  lines w0.1: -0.55,-0.3 0.55,-0.3 0.55,0.3 -0.55,0.3 -0.55,-0.3
Mechanical 15:
  lines w0.05: -0.75,-0.4 0.75,-0.4 0.75,0.4 -0.75,0.4 -0.75,-0.4
  lines w0.1: -0.3,0 0.3,0 ; 0,-0.3 0,0.3
3D body: height 0.4, standoff 0, extent 0.3,-0.3 0.55,0.3
3D body: height 0.4, standoff 0, extent -0.55,-0.3 -0.3,0.3
3D body: height 0.4, standoff 0, extent -0.3,-0.3 0.3,0.3

## RESC1005X40X25ML05T05 [mm] "Chip Resistor, 2-Leads, Body 1.05x0.55mm, IPC Low Density"
height 0.4
pads (2):
  rect 0.65x0.65 smd: 1(-0.5,0) 2(0.5,0)
Mechanical 13:
  lines w0.1: -0.525,-0.275 -0.525,0.275 0.525,0.275 0.525,-0.275 -0.525,-0.275
Mechanical 15:
  lines w0.05: -1.05,-0.55 -1.05,0.55 1.05,0.55 1.05,-0.55 -1.05,-0.55
  lines w0.1: -0.275,0 0.275,0 ; 0,-0.275 0,0.275
3D body "RESC1005X04M.step": height 0.4, standoff 0, extent -0.525,-0.275 0.525,0.275

## RESC1005X40X25ML05T05_2 [mm]
pads (2):
  rect 0.65x0.65 smd: 1(-0.5,0) 2(0.5,0)
Mechanical 13:
  lines w0.1: -0.525,-0.275 0.525,-0.275 0.525,0.275 -0.525,0.275 -0.525,-0.275
Mechanical 15:
  lines w0.05: -1.05,-0.55 1.05,-0.55 1.05,0.55 -1.05,0.55 -1.05,-0.55
  lines w0.1: -0.275,0 0.275,0 ; 0,-0.275 0,0.275
3D body: height 0.4, standoff 0, extent 0.275,-0.275 0.525,0.275
3D body: height 0.4, standoff 0, extent -0.525,-0.275 -0.275,0.275
3D body: height 0.4, standoff 0, extent -0.275,-0.275 0.275,0.275

## RESC1005X40X25ML10T10 [mm] "Chip Resistor, 2-Leads, Body 1.00x0.50mm, IPC Low Density"
height 0.4
pads (2):
  rect 0.75x0.7 smd: 1(-0.475,0) 2(0.475,0)
Mechanical 13:
  lines w0.1: -0.55,-0.3 0.55,-0.3 0.55,0.3 -0.55,0.3 -0.55,-0.3
Mechanical 15:
  lines w0.05: -1.05,-0.55 1.05,-0.55 1.05,0.55 -1.05,0.55 -1.05,-0.55
  lines w0.1: -0.3,0 0.3,0 ; 0,-0.3 0,0.3
3D body: height 0.4, standoff 0, extent 0.3,-0.3 0.55,0.3
3D body: height 0.4, standoff 0, extent -0.55,-0.3 -0.3,0.3
3D body: height 0.4, standoff 0, extent -0.3,-0.3 0.3,0.3